# Altium schematic symbol library jlcpcb_2025_04_capacitors_extended_0603.schlib: 3668 symbols (part 18 of 20)
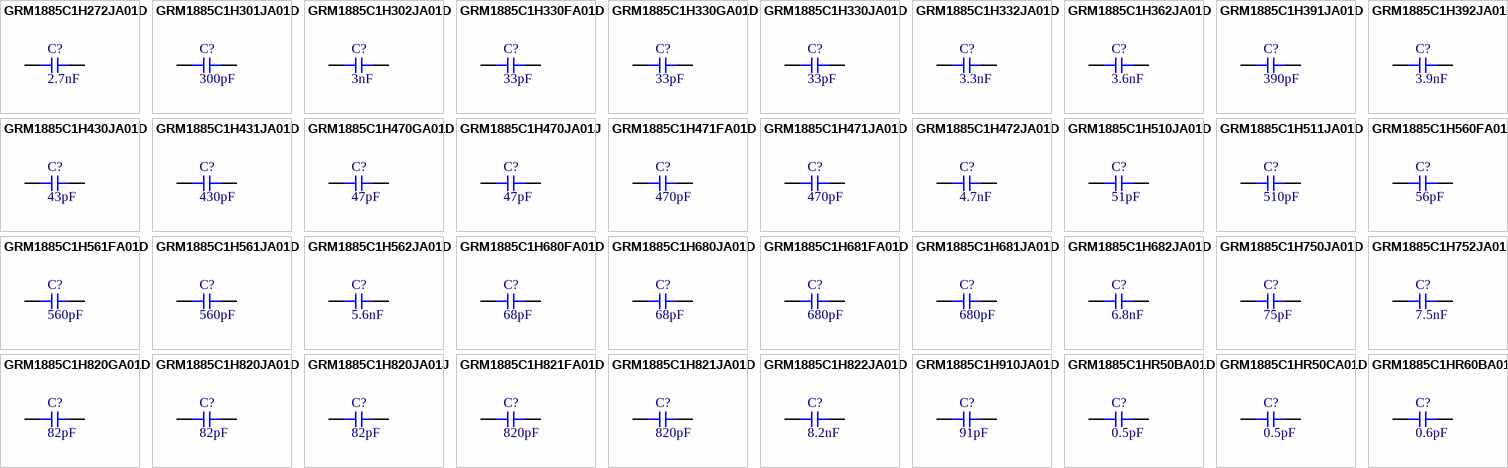
[diagram p108: symbols GRM1885C1H272JA01D to GRM1885C1HR60BA01D]

## GRM1885C1H561JA01D
designator C?  Capacitance: 560pF  (hidden comment: *)
Capacitor, Ceramic (MLCC), 560pF, ±5%, 50V, C0G, ±5%, SMD 0603; Manufacturer: Murata Electronics; Manufacturer Part Number: GRM1885C1H561JA01D; Package Size: 0603; JLCPCB Basic Part: No; JLCPCB Part Number: C97881; Supplier 1: LCSC; Category: Capacitors - MLCC; Supplier Part Number 1: C97881; Tolerance: ±5%; Voltage Rating: 50V; Temperature Coefficient: C0G; RoHS: Yes; ComponentLink1Description: Datasheet; ComponentLink1URL: https://wmsc.lcsc.com/wmsc/upload/file/pdf/v2/lcsc/1810311111_Murata-Electronics-GRM1885C1H561JA01D_C97881.pdf; ComponentLink2Description: JLCPCB Part URL; ComponentLink2URL: https://jlcpcb.com/partdetail/C97881; ComponentLink3Description: LCSC Part URL; ComponentLink3URL: https://lcsc.com/product-detail/Multilayer-Ceramic-Capacitors-MLCC---SMD-SMT_Murata-Electronics-Murata-Electronics-GRM1885C1H561JA01D_C97881.html
footprint CAP-0603 (0603 (1608M) Capacitor)
pins: 1, 2

## GRM1885C1H562JA01D
designator C?  Capacitance: 5.6nF  (hidden comment: *)
Capacitor, Ceramic (MLCC), 5.6nF, ±5%, 50V, C0G, ±5%, SMD 0603; Manufacturer: Murata Electronics; Manufacturer Part Number: GRM1885C1H562JA01D; Package Size: 0603; JLCPCB Basic Part: No; JLCPCB Part Number: C440183; Supplier 1: LCSC; Category: Capacitors - MLCC; Supplier Part Number 1: C440183; Tolerance: ±5%; Voltage Rating: 50V; Temperature Coefficient: C0G; RoHS: Yes; ComponentLink1Description: Datasheet; ComponentLink1URL: https://wmsc.lcsc.com/wmsc/upload/file/pdf/v2/lcsc/2304140030_Murata-Electronics-GRM1885C1H562JA01D_C440183.pdf; ComponentLink2Description: JLCPCB Part URL; ComponentLink2URL: https://jlcpcb.com/partdetail/C440183; ComponentLink3Description: LCSC Part URL; ComponentLink3URL: https://lcsc.com/product-detail/Multilayer-Ceramic-Capacitors-MLCC---SMD-SMT_Murata-Electronics-Murata-Electronics-GRM1885C1H562JA01D_C440183.html
footprint CAP-0603 (0603 (1608M) Capacitor)
pins: 1, 2

## GRM1885C1H680FA01D
designator C?  Capacitance: 68pF  (hidden comment: *)
Capacitor, Ceramic (MLCC), 68pF, ±1%, 50V, C0G, ±1%, SMD 0603; Manufacturer: Murata Electronics; Manufacturer Part Number: GRM1885C1H680FA01D; Package Size: 0603; JLCPCB Basic Part: No; JLCPCB Part Number: C237335; Supplier 1: LCSC; Category: Capacitors - MLCC; Supplier Part Number 1: C237335; Tolerance: ±1%; Voltage Rating: 50V; Temperature Coefficient: C0G; RoHS: Yes; ComponentLink1Description: Datasheet; ComponentLink1URL: https://wmsc.lcsc.com/wmsc/upload/file/pdf/v2/lcsc/2105241141_Murata-Electronics-GRM1885C1H680FA01D_C237335.pdf; ComponentLink2Description: JLCPCB Part URL; ComponentLink2URL: https://jlcpcb.com/partdetail/C237335; ComponentLink3Description: LCSC Part URL; ComponentLink3URL: https://lcsc.com/product-detail/Multilayer-Ceramic-Capacitors-MLCC---SMD-SMT_Murata-Electronics-Murata-Electronics-GRM1885C1H680FA01D_C237335.html
footprint CAP-0603 (0603 (1608M) Capacitor)
pins: 1, 2

## GRM1885C1H680JA01D
designator C?  Capacitance: 68pF  (hidden comment: *)
Capacitor, Ceramic (MLCC), 68pF, ±5%, 50V, C0G, ±5%, SMD 0603; Manufacturer: Murata Electronics; Manufacturer Part Number: GRM1885C1H680JA01D; Package Size: 0603; JLCPCB Basic Part: No; JLCPCB Part Number: C85981; Supplier 1: LCSC; Category: Capacitors - MLCC; Supplier Part Number 1: C85981; Tolerance: ±5%; Voltage Rating: 50V; Temperature Coefficient: C0G; RoHS: Yes; ComponentLink1Description: Datasheet; ComponentLink1URL: https://wmsc.lcsc.com/wmsc/upload/file/pdf/v2/lcsc/2304140030_Murata-Electronics-GRM1885C1H680JA01D_C85981.pdf; ComponentLink2Description: JLCPCB Part URL; ComponentLink2URL: https://jlcpcb.com/partdetail/C85981; ComponentLink3Description: LCSC Part URL; ComponentLink3URL: https://lcsc.com/product-detail/Multilayer-Ceramic-Capacitors-MLCC---SMD-SMT_Murata-Electronics-Murata-Electronics-GRM1885C1H680JA01D_C85981.html
footprint CAP-0603 (0603 (1608M) Capacitor)
pins: 1, 2

## GRM1885C1H681FA01D
designator C?  Capacitance: 680pF  (hidden comment: *)
Capacitor, Ceramic (MLCC), 680pF, ±1%, 50V, C0G, ±1%, SMD 0603; Manufacturer: Murata Electronics; Manufacturer Part Number: GRM1885C1H681FA01D; Package Size: 0603; JLCPCB Basic Part: No; JLCPCB Part Number: C527977; Supplier 1: LCSC; Category: Capacitors - MLCC; Supplier Part Number 1: C527977; Tolerance: ±1%; Voltage Rating: 50V; Temperature Coefficient: C0G; RoHS: Yes; ComponentLink1Description: Datasheet; ComponentLink1URL: https://wmsc.lcsc.com/wmsc/upload/file/pdf/v2/lcsc/2008191834_Murata-Electronics-GRM1885C1H681FA01D_C527977.pdf; ComponentLink2Description: JLCPCB Part URL; ComponentLink2URL: https://jlcpcb.com/partdetail/C527977; ComponentLink3Description: LCSC Part URL; ComponentLink3URL: https://lcsc.com/product-detail/Multilayer-Ceramic-Capacitors-MLCC---SMD-SMT_Murata-Electronics-Murata-Electronics-GRM1885C1H681FA01D_C527977.html
footprint CAP-0603 (0603 (1608M) Capacitor)
pins: 1, 2

## GRM1885C1H681JA01D
designator C?  Capacitance: 680pF  (hidden comment: *)
Capacitor, Ceramic (MLCC), 680pF, ±5%, 50V, C0G, ±5%, SMD 0603; Manufacturer: Murata Electronics; Manufacturer Part Number: GRM1885C1H681JA01D; Package Size: 0603; JLCPCB Basic Part: No; JLCPCB Part Number: C97882; Supplier 1: LCSC; Category: Capacitors - MLCC; Supplier Part Number 1: C97882; Tolerance: ±5%; Voltage Rating: 50V; Temperature Coefficient: C0G; RoHS: Yes; ComponentLink1Description: Datasheet; ComponentLink1URL: https://wmsc.lcsc.com/wmsc/upload/file/pdf/v2/lcsc/1810311111_Murata-Electronics-GRM1885C1H681JA01D_C97882.pdf; ComponentLink2Description: JLCPCB Part URL; ComponentLink2URL: https://jlcpcb.com/partdetail/C97882; ComponentLink3Description: LCSC Part URL; ComponentLink3URL: https://lcsc.com/product-detail/Multilayer-Ceramic-Capacitors-MLCC---SMD-SMT_Murata-Electronics-Murata-Electronics-GRM1885C1H681JA01D_C97882.html
footprint CAP-0603 (0603 (1608M) Capacitor)
pins: 1, 2

## GRM1885C1H682JA01D
designator C?  Capacitance: 6.8nF  (hidden comment: *)
Capacitor, Ceramic (MLCC), 6.8nF, ±5%, 50V, C0G, ±5%, SMD 0603; Manufacturer: Murata Electronics; Manufacturer Part Number: GRM1885C1H682JA01D; Package Size: 0603; JLCPCB Basic Part: No; JLCPCB Part Number: C162241; Supplier 1: LCSC; Category: Capacitors - MLCC; Supplier Part Number 1: C162241; Tolerance: ±5%; Voltage Rating: 50V; Temperature Coefficient: C0G; RoHS: Yes; ComponentLink1Description: Datasheet; ComponentLink1URL: https://wmsc.lcsc.com/wmsc/upload/file/pdf/v2/lcsc/1810311150_Murata-Electronics-GRM1885C1H682JA01D_C162241.pdf; ComponentLink2Description: JLCPCB Part URL; ComponentLink2URL: https://jlcpcb.com/partdetail/C162241; ComponentLink3Description: LCSC Part URL; ComponentLink3URL: https://lcsc.com/product-detail/Multilayer-Ceramic-Capacitors-MLCC---SMD-SMT_Murata-Electronics-Murata-Electronics-GRM1885C1H682JA01D_C162241.html
footprint CAP-0603 (0603 (1608M) Capacitor)
pins: 1, 2

## GRM1885C1H750JA01D
designator C?  Capacitance: 75pF  (hidden comment: *)
Capacitor, Ceramic (MLCC), 75pF, ±5%, null, null, ±5%, SMD 0603; Manufacturer: Murata Electronics; Manufacturer Part Number: GRM1885C1H750JA01D; Package Size: 0603; JLCPCB Basic Part: No; JLCPCB Part Number: C426100; Supplier 1: LCSC; Category: Capacitors - MLCC; Supplier Part Number 1: C426100; Tolerance: ±5%; Voltage Rating: null; Temperature Coefficient: null; RoHS: Yes; ComponentLink1Description: Datasheet; ComponentLink1URL: https://wmsc.lcsc.com/wmsc/upload/file/pdf/v2/lcsc/2304140030_Murata-Electronics-GRM1885C1H750JA01D_C426100.pdf; ComponentLink2Description: JLCPCB Part URL; ComponentLink2URL: https://jlcpcb.com/partdetail/C426100; ComponentLink3Description: LCSC Part URL; ComponentLink3URL: https://lcsc.com/product-detail/Multilayer-Ceramic-Capacitors-MLCC---SMD-SMT_Murata-Electronics-Murata-Electronics-GRM1885C1H750JA01D_C426100.html
footprint CAP-0603 (0603 (1608M) Capacitor)
pins: 1, 2

## GRM1885C1H752JA01D
designator C?  Capacitance: 7.5nF  (hidden comment: *)
Capacitor, Ceramic (MLCC), 7.5nF, ±5%, ±5%, SMD 0603; Manufacturer: Murata Electronics; Manufacturer Part Number: GRM1885C1H752JA01D; Package Size: 0603; JLCPCB Basic Part: No; JLCPCB Part Number: C907758; Supplier 1: LCSC; Category: Capacitors - MLCC; Supplier Part Number 1: C907758; Tolerance: ±5%; RoHS: Yes; ComponentLink1Description: Datasheet; ComponentLink1URL: https://wmsc.lcsc.com/wmsc/upload/file/pdf/v2/lcsc/2201242100_Murata-Electronics-GRM1885C1H752JA01D_C907758.pdf; ComponentLink2Description: JLCPCB Part URL; ComponentLink2URL: https://jlcpcb.com/partdetail/C907758; ComponentLink3Description: LCSC Part URL; ComponentLink3URL: https://lcsc.com/product-detail/Multilayer-Ceramic-Capacitors-MLCC---SMD-SMT_Murata-Electronics-Murata-Electronics-GRM1885C1H752JA01D_C907758.html
footprint CAP-0603 (0603 (1608M) Capacitor)
pins: 1, 2

## GRM1885C1H820GA01D
designator C?  Capacitance: 82pF  (hidden comment: *)
Capacitor, Ceramic (MLCC), 82pF, ±2%, null, null, ±2%, SMD 0603; Manufacturer: Murata Electronics; Manufacturer Part Number: GRM1885C1H820GA01D; Package Size: 0603; JLCPCB Basic Part: No; JLCPCB Part Number: C882516; Supplier 1: LCSC; Category: Capacitors - MLCC; Supplier Part Number 1: C882516; Tolerance: ±2%; Voltage Rating: null; Temperature Coefficient: null; RoHS: Yes; ComponentLink1Description: Datasheet; ComponentLink1URL: https://wmsc.lcsc.com/wmsc/upload/file/pdf/v2/lcsc/2201242130_Murata-Electronics-GRM1885C1H820GA01D_C882516.pdf; ComponentLink2Description: JLCPCB Part URL; ComponentLink2URL: https://jlcpcb.com/partdetail/C882516; ComponentLink3Description: LCSC Part URL; ComponentLink3URL: https://lcsc.com/product-detail/Multilayer-Ceramic-Capacitors-MLCC---SMD-SMT_Murata-Electronics-Murata-Electronics-GRM1885C1H820GA01D_C882516.html
footprint CAP-0603 (0603 (1608M) Capacitor)
pins: 1, 2

## GRM1885C1H820JA01D
designator C?  Capacitance: 82pF  (hidden comment: *)
Capacitor, Ceramic (MLCC), 82pF, ±5%, 50V, C0G, ±5%, SMD 0603; Manufacturer: Murata Electronics; Manufacturer Part Number: GRM1885C1H820JA01D; Package Size: 0603; JLCPCB Basic Part: No; JLCPCB Part Number: C97883; Supplier 1: LCSC; Category: Capacitors - MLCC; Supplier Part Number 1: C97883; Tolerance: ±5%; Voltage Rating: 50V; Temperature Coefficient: C0G; RoHS: Yes; ComponentLink1Description: Datasheet; ComponentLink1URL: https://wmsc.lcsc.com/wmsc/upload/file/pdf/v2/lcsc/1810311111_Murata-Electronics-GRM1885C1H820JA01D_C97883.pdf; ComponentLink2Description: JLCPCB Part URL; ComponentLink2URL: https://jlcpcb.com/partdetail/C97883; ComponentLink3Description: LCSC Part URL; ComponentLink3URL: https://lcsc.com/product-detail/Multilayer-Ceramic-Capacitors-MLCC---SMD-SMT_Murata-Electronics-Murata-Electronics-GRM1885C1H820JA01D_C97883.html
footprint CAP-0603 (0603 (1608M) Capacitor)
pins: 1, 2

## GRM1885C1H820JA01J
designator C?  Capacitance: 82pF  (hidden comment: *)
Capacitor, Ceramic (MLCC), 82pF, ±5%, ±5%, SMD 0603; Manufacturer: Murata Electronics; Manufacturer Part Number: GRM1885C1H820JA01J; Package Size: 0603; JLCPCB Basic Part: No; JLCPCB Part Number: C908006; Supplier 1: LCSC; Category: Capacitors - MLCC; Supplier Part Number 1: C908006; Tolerance: ±5%; RoHS: Yes; ComponentLink1Description: Datasheet; ComponentLink1URL: https://wmsc.lcsc.com/wmsc/upload/file/pdf/v2/lcsc/2201242100_Murata-Electronics-GRM1885C1H820JA01J_C908006.pdf; ComponentLink2Description: JLCPCB Part URL; ComponentLink2URL: https://jlcpcb.com/partdetail/C908006; ComponentLink3Description: LCSC Part URL; ComponentLink3URL: https://lcsc.com/product-detail/Multilayer-Ceramic-Capacitors-MLCC---SMD-SMT_Murata-Electronics-Murata-Electronics-GRM1885C1H820JA01J_C908006.html
footprint CAP-0603 (0603 (1608M) Capacitor)
pins: 1, 2

## GRM1885C1H821FA01D
designator C?  Capacitance: 820pF  (hidden comment: *)
Capacitor, Ceramic (MLCC), 820pF, ±1%, 50V, C0G, ±1%, SMD 0603; Manufacturer: Murata Electronics; Manufacturer Part Number: GRM1885C1H821FA01D; Package Size: 0603; JLCPCB Basic Part: No; JLCPCB Part Number: C524621; Supplier 1: LCSC; Category: Capacitors - MLCC; Supplier Part Number 1: C524621; Tolerance: ±1%; Voltage Rating: 50V; Temperature Coefficient: C0G; RoHS: Yes; ComponentLink1Description: Datasheet; ComponentLink1URL: https://wmsc.lcsc.com/wmsc/upload/file/pdf/v2/lcsc/2304140030_Murata-Electronics-GRM1885C1H821FA01D_C524621.pdf; ComponentLink2Description: JLCPCB Part URL; ComponentLink2URL: https://jlcpcb.com/partdetail/C524621; ComponentLink3Description: LCSC Part URL; ComponentLink3URL: https://lcsc.com/product-detail/Multilayer-Ceramic-Capacitors-MLCC---SMD-SMT_Murata-Electronics-Murata-Electronics-GRM1885C1H821FA01D_C524621.html
footprint CAP-0603 (0603 (1608M) Capacitor)
pins: 1, 2

## GRM1885C1H821JA01D
designator C?  Capacitance: 820pF  (hidden comment: *)
Capacitor, Ceramic (MLCC), 820pF, ±5%, 50V, C0G, ±5%, SMD 0603; Manufacturer: Murata Electronics; Manufacturer Part Number: GRM1885C1H821JA01D; Package Size: 0603; JLCPCB Basic Part: No; JLCPCB Part Number: C701305; Supplier 1: LCSC; Category: Capacitors - MLCC; Supplier Part Number 1: C701305; Tolerance: ±5%; Voltage Rating: 50V; Temperature Coefficient: C0G; RoHS: Yes; ComponentLink1Description: Datasheet; ComponentLink1URL: https://wmsc.lcsc.com/wmsc/upload/file/pdf/v2/lcsc/2304140030_Murata-Electronics-GRM1885C1H821JA01D_C701305.pdf; ComponentLink2Description: JLCPCB Part URL; ComponentLink2URL: https://jlcpcb.com/partdetail/C701305; ComponentLink3Description: LCSC Part URL; ComponentLink3URL: https://lcsc.com/product-detail/Multilayer-Ceramic-Capacitors-MLCC---SMD-SMT_Murata-Electronics-Murata-Electronics-GRM1885C1H821JA01D_C701305.html
footprint CAP-0603 (0603 (1608M) Capacitor)
pins: 1, 2

## GRM1885C1H822JA01D
designator C?  Capacitance: 8.2nF  (hidden comment: *)
Capacitor, Ceramic (MLCC), 8.2nF, ±5%, 50V, null, ±5%, SMD 0603; Manufacturer: Murata Electronics; Manufacturer Part Number: GRM1885C1H822JA01D; Package Size: 0603; JLCPCB Basic Part: No; JLCPCB Part Number: C162249; Supplier 1: LCSC; Category: Capacitors - MLCC; Supplier Part Number 1: C162249; Tolerance: ±5%; Voltage Rating: 50V; Temperature Coefficient: null; RoHS: Yes; ComponentLink1Description: Datasheet; ComponentLink1URL: https://wmsc.lcsc.com/wmsc/upload/file/pdf/v2/lcsc/2304140030_Murata-Electronics-GRM1885C1H822JA01D_C162249.pdf; ComponentLink2Description: JLCPCB Part URL; ComponentLink2URL: https://jlcpcb.com/partdetail/C162249; ComponentLink3Description: LCSC Part URL; ComponentLink3URL: https://lcsc.com/product-detail/Multilayer-Ceramic-Capacitors-MLCC---SMD-SMT_Murata-Electronics-Murata-Electronics-GRM1885C1H822JA01D_C162249.html
footprint CAP-0603 (0603 (1608M) Capacitor)
pins: 1, 2

## GRM1885C1H910JA01D
designator C?  Capacitance: 91pF  (hidden comment: *)
Capacitor, Ceramic (MLCC), 91pF, ±5%, null, null, ±5%, SMD 0603; Manufacturer: Murata Electronics; Manufacturer Part Number: GRM1885C1H910JA01D; Package Size: 0603; JLCPCB Basic Part: No; JLCPCB Part Number: C701317; Supplier 1: LCSC; Category: Capacitors - MLCC; Supplier Part Number 1: C701317; Tolerance: ±5%; Voltage Rating: null; Temperature Coefficient: null; RoHS: Yes; ComponentLink1Description: Datasheet; ComponentLink1URL: https://wmsc.lcsc.com/wmsc/upload/file/pdf/v2/lcsc/2304140030_Murata-Electronics-GRM1885C1H910JA01D_C701317.pdf; ComponentLink2Description: JLCPCB Part URL; ComponentLink2URL: https://jlcpcb.com/partdetail/C701317; ComponentLink3Description: LCSC Part URL; ComponentLink3URL: https://lcsc.com/product-detail/Multilayer-Ceramic-Capacitors-MLCC---SMD-SMT_Murata-Electronics-Murata-Electronics-GRM1885C1H910JA01D_C701317.html
footprint CAP-0603 (0603 (1608M) Capacitor)
pins: 1, 2

## GRM1885C1HR50BA01D
designator C?  Capacitance: 0.5pF  (hidden comment: *)
Capacitor, Ceramic (MLCC), 0.5pF, 50V, C0G, SMD 0603; Manufacturer: Murata Electronics; Manufacturer Part Number: GRM1885C1HR50BA01D; Package Size: 0603; JLCPCB Basic Part: No; JLCPCB Part Number: C162254; Supplier 1: LCSC; Category: Capacitors - MLCC; Supplier Part Number 1: C162254; Voltage Rating: 50V; Temperature Coefficient: C0G; RoHS: Yes; ComponentLink1Description: Datasheet; ComponentLink1URL: https://wmsc.lcsc.com/wmsc/upload/file/pdf/v2/lcsc/2304140030_Murata-Electronics-GRM1885C1HR50BA01D_C162254.pdf; ComponentLink2Description: JLCPCB Part URL; ComponentLink2URL: https://jlcpcb.com/partdetail/C162254; ComponentLink3Description: LCSC Part URL; ComponentLink3URL: https://lcsc.com/product-detail/Multilayer-Ceramic-Capacitors-MLCC---SMD-SMT_Murata-Electronics-Murata-Electronics-GRM1885C1HR50BA01D_C162254.html
footprint CAP-0603 (0603 (1608M) Capacitor)
pins: 1, 2

## GRM1885C1HR50CA01D
designator C?  Capacitance: 0.5pF  (hidden comment: *)
Capacitor, Ceramic (MLCC), 0.5pF, 50V, C0G, SMD 0603; Manufacturer: Murata Electronics; Manufacturer Part Number: GRM1885C1HR50CA01D; Package Size: 0603; JLCPCB Basic Part: No; JLCPCB Part Number: C162255; Supplier 1: LCSC; Category: Capacitors - MLCC; Supplier Part Number 1: C162255; Voltage Rating: 50V; Temperature Coefficient: C0G; RoHS: Yes; ComponentLink1Description: Datasheet; ComponentLink1URL: https://wmsc.lcsc.com/wmsc/upload/file/pdf/v2/lcsc/2304140030_Murata-Electronics-GRM1885C1HR50CA01D_C162255.pdf; ComponentLink2Description: JLCPCB Part URL; ComponentLink2URL: https://jlcpcb.com/partdetail/C162255; ComponentLink3Description: LCSC Part URL; ComponentLink3URL: https://lcsc.com/product-detail/Multilayer-Ceramic-Capacitors-MLCC---SMD-SMT_Murata-Electronics-Murata-Electronics-GRM1885C1HR50CA01D_C162255.html
footprint CAP-0603 (0603 (1608M) Capacitor)
pins: 1, 2

## GRM1885C1HR60BA01D
designator C?  Capacitance: 0.6pF  (hidden comment: *)
Capacitor, Ceramic (MLCC), 0.6pF, null, null, SMD 0603; Manufacturer: Murata Electronics; Manufacturer Part Number: GRM1885C1HR60BA01D; Package Size: 0603; JLCPCB Basic Part: No; JLCPCB Part Number: C882515; Supplier 1: LCSC; Category: Capacitors - MLCC; Supplier Part Number 1: C882515; Voltage Rating: null; Temperature Coefficient: null; RoHS: Yes; ComponentLink1Description: Datasheet; ComponentLink1URL: https://wmsc.lcsc.com/wmsc/upload/file/pdf/v2/lcsc/2201242130_Murata-Electronics-GRM1885C1HR60BA01D_C882515.pdf; ComponentLink2Description: JLCPCB Part URL; ComponentLink2URL: https://jlcpcb.com/partdetail/C882515; ComponentLink3Description: LCSC Part URL; ComponentLink3URL: https://lcsc.com/product-detail/Multilayer-Ceramic-Capacitors-MLCC---SMD-SMT_Murata-Electronics-Murata-Electronics-GRM1885C1HR60BA01D_C882515.html
footprint CAP-0603 (0603 (1608M) Capacitor)
pins: 1, 2

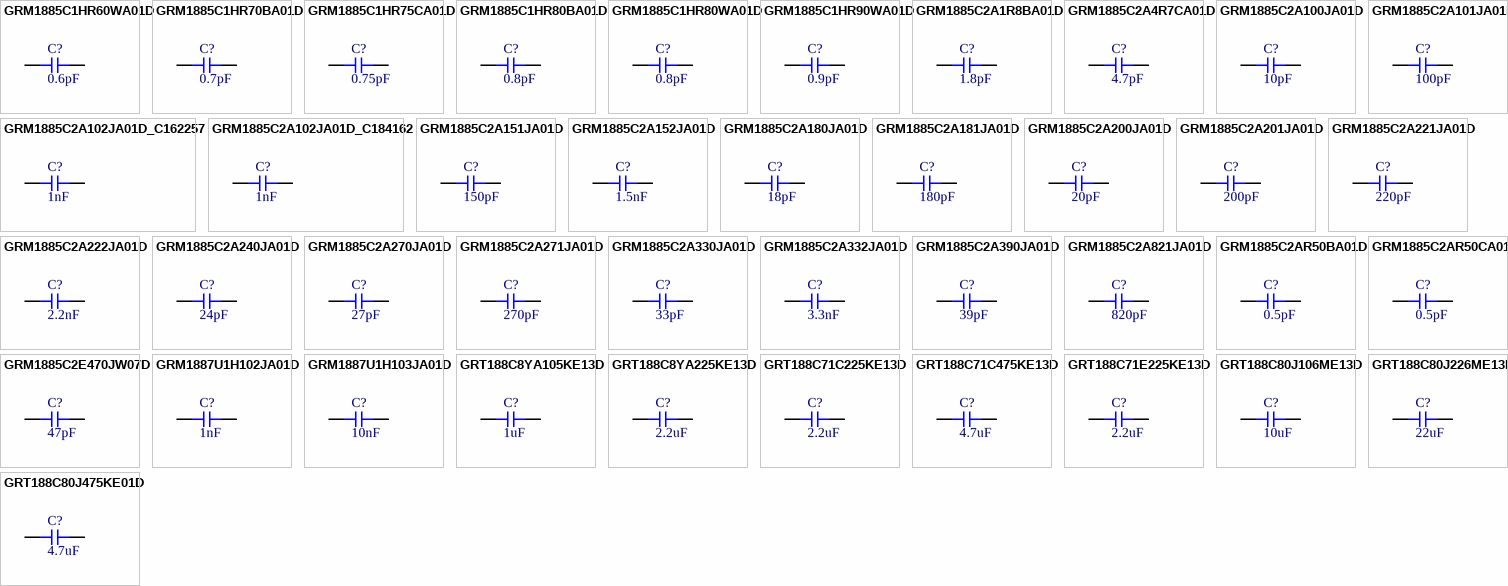
[diagram p79: symbols GRM1885C1HR60WA01D to GRT188C80J475KE01D]

## GRM1885C1HR60WA01D
designator C?  Capacitance: 0.6pF  (hidden comment: *)
Capacitor, Ceramic (MLCC), 0.6pF, 50V, C0G, SMD 0603; Manufacturer: Murata Electronics; Manufacturer Part Number: GRM1885C1HR60WA01D; Package Size: 0603; JLCPCB Basic Part: No; JLCPCB Part Number: C415380; Supplier 1: LCSC; Category: Capacitors - MLCC; Supplier Part Number 1: C415380; Voltage Rating: 50V; Temperature Coefficient: C0G; RoHS: Yes; ComponentLink1Description: Datasheet; ComponentLink1URL: https://wmsc.lcsc.com/wmsc/upload/file/pdf/v2/lcsc/2304140030_Murata-Electronics-GRM1885C1HR60WA01D_C415380.pdf; ComponentLink2Description: JLCPCB Part URL; ComponentLink2URL: https://jlcpcb.com/partdetail/C415380; ComponentLink3Description: LCSC Part URL; ComponentLink3URL: https://lcsc.com/product-detail/Multilayer-Ceramic-Capacitors-MLCC---SMD-SMT_Murata-Electronics-Murata-Electronics-GRM1885C1HR60WA01D_C415380.html
footprint CAP-0603 (0603 (1608M) Capacitor)
pins: 1, 2

## GRM1885C1HR70BA01D
designator C?  Capacitance: 0.7pF  (hidden comment: *)
Capacitor, Ceramic (MLCC), 0.7pF, 50V, C0G, SMD 0603; Manufacturer: Murata Electronics; Manufacturer Part Number: GRM1885C1HR70BA01D; Package Size: 0603; JLCPCB Basic Part: No; JLCPCB Part Number: C162256; Supplier 1: LCSC; Category: Capacitors - MLCC; Supplier Part Number 1: C162256; Voltage Rating: 50V; Temperature Coefficient: C0G; RoHS: Yes; ComponentLink1Description: Datasheet; ComponentLink1URL: https://wmsc.lcsc.com/wmsc/upload/file/pdf/v2/lcsc/2308111712_Murata-Electronics-GRM1885C1HR70BA01D_C162256.pdf; ComponentLink2Description: JLCPCB Part URL; ComponentLink2URL: https://jlcpcb.com/partdetail/C162256; ComponentLink3Description: LCSC Part URL; ComponentLink3URL: https://lcsc.com/product-detail/Multilayer-Ceramic-Capacitors-MLCC---SMD-SMT_Murata-Electronics-Murata-Electronics-GRM1885C1HR70BA01D_C162256.html
footprint CAP-0603 (0603 (1608M) Capacitor)
pins: 1, 2

## GRM1885C1HR75CA01D
designator C?  Capacitance: 0.75pF  (hidden comment: *)
Capacitor, Ceramic (MLCC), 0.75pF, 50V, C0G, SMD 0603; Manufacturer: Murata Electronics; Manufacturer Part Number: GRM1885C1HR75CA01D; Package Size: 0603; JLCPCB Basic Part: No; JLCPCB Part Number: C85982; Supplier 1: LCSC; Category: Capacitors - MLCC; Supplier Part Number 1: C85982; Voltage Rating: 50V; Temperature Coefficient: C0G; RoHS: Yes; ComponentLink1Description: Datasheet; ComponentLink1URL: https://wmsc.lcsc.com/wmsc/upload/file/pdf/v2/lcsc/2304140030_Murata-Electronics-GRM1885C1HR75CA01D_C85982.pdf; ComponentLink2Description: JLCPCB Part URL; ComponentLink2URL: https://jlcpcb.com/partdetail/C85982; ComponentLink3Description: LCSC Part URL; ComponentLink3URL: https://lcsc.com/product-detail/Multilayer-Ceramic-Capacitors-MLCC---SMD-SMT_Murata-Electronics-Murata-Electronics-GRM1885C1HR75CA01D_C85982.html
footprint CAP-0603 (0603 (1608M) Capacitor)
pins: 1, 2

## GRM1885C1HR80BA01D
designator C?  Capacitance: 0.8pF  (hidden comment: *)
Capacitor, Ceramic (MLCC), 0.8pF, 50V, C0G, SMD 0603; Manufacturer: Murata Electronics; Manufacturer Part Number: GRM1885C1HR80BA01D; Package Size: 0603; JLCPCB Basic Part: No; JLCPCB Part Number: C3880629; Supplier 1: LCSC; Category: Capacitors - MLCC; Supplier Part Number 1: C3880629; Voltage Rating: 50V; Temperature Coefficient: C0G; RoHS: Yes; ComponentLink1Description: Datasheet; ComponentLink1URL: https://wmsc.lcsc.com/wmsc/upload/file/pdf/v2/lcsc/2308111758_Murata-Electronics-GRM1885C1HR80BA01D_C3880629.pdf; ComponentLink2Description: JLCPCB Part URL; ComponentLink2URL: https://jlcpcb.com/partdetail/C3880629; ComponentLink3Description: LCSC Part URL; ComponentLink3URL: https://lcsc.com/product-detail/Multilayer-Ceramic-Capacitors-MLCC---SMD-SMT_Murata-Electronics-Murata-Electronics-GRM1885C1HR80BA01D_C3880629.html
footprint CAP-0603 (0603 (1608M) Capacitor)
pins: 1, 2

## GRM1885C1HR80WA01D
designator C?  Capacitance: 0.8pF  (hidden comment: *)
Capacitor, Ceramic (MLCC), 0.8pF, SMD 0603; Manufacturer: Murata Electronics; Manufacturer Part Number: GRM1885C1HR80WA01D; Package Size: 0603; JLCPCB Basic Part: No; JLCPCB Part Number: C907996; Supplier 1: LCSC; Category: Capacitors - MLCC; Supplier Part Number 1: C907996; RoHS: Yes; ComponentLink1Description: Datasheet; ComponentLink1URL: https://wmsc.lcsc.com/wmsc/upload/file/pdf/v2/lcsc/2201242100_Murata-Electronics-GRM1885C1HR80WA01D_C907996.pdf; ComponentLink2Description: JLCPCB Part URL; ComponentLink2URL: https://jlcpcb.com/partdetail/C907996; ComponentLink3Description: LCSC Part URL; ComponentLink3URL: https://lcsc.com/product-detail/Multilayer-Ceramic-Capacitors-MLCC---SMD-SMT_Murata-Electronics-Murata-Electronics-GRM1885C1HR80WA01D_C907996.html
footprint CAP-0603 (0603 (1608M) Capacitor)
pins: 1, 2

## GRM1885C1HR90WA01D
designator C?  Capacitance: 0.9pF  (hidden comment: *)
Capacitor, Ceramic (MLCC), 0.9pF, 50V, C0G, SMD 0603; Manufacturer: Murata Electronics; Manufacturer Part Number: GRM1885C1HR90WA01D; Package Size: 0603; JLCPCB Basic Part: No; JLCPCB Part Number: C415547; Supplier 1: LCSC; Category: Capacitors - MLCC; Supplier Part Number 1: C415547; Voltage Rating: 50V; Temperature Coefficient: C0G; RoHS: Yes; ComponentLink1Description: Datasheet; ComponentLink1URL: https://wmsc.lcsc.com/wmsc/upload/file/pdf/v2/lcsc/2304140030_Murata-Electronics-GRM1885C1HR90WA01D_C415547.pdf; ComponentLink2Description: JLCPCB Part URL; ComponentLink2URL: https://jlcpcb.com/partdetail/C415547; ComponentLink3Description: LCSC Part URL; ComponentLink3URL: https://lcsc.com/product-detail/Multilayer-Ceramic-Capacitors-MLCC---SMD-SMT_Murata-Electronics-Murata-Electronics-GRM1885C1HR90WA01D_C415547.html
footprint CAP-0603 (0603 (1608M) Capacitor)
pins: 1, 2

## GRM1885C2A1R8BA01D
designator C?  Capacitance: 1.8pF  (hidden comment: *)
Capacitor, Ceramic (MLCC), 1.8pF, 100V, C0G, SMD 0603; Manufacturer: Murata Electronics; Manufacturer Part Number: GRM1885C2A1R8BA01D; Package Size: 0603; JLCPCB Basic Part: No; JLCPCB Part Number: C408134; Supplier 1: LCSC; Category: Capacitors - MLCC; Supplier Part Number 1: C408134; Voltage Rating: 100V; Temperature Coefficient: C0G; RoHS: Yes; ComponentLink1Description: Datasheet; ComponentLink1URL: https://wmsc.lcsc.com/wmsc/upload/file/pdf/v2/lcsc/2304140030_Murata-Electronics-GRM1885C2A1R8BA01D_C408134.pdf; ComponentLink2Description: JLCPCB Part URL; ComponentLink2URL: https://jlcpcb.com/partdetail/C408134; ComponentLink3Description: LCSC Part URL; ComponentLink3URL: https://lcsc.com/product-detail/Multilayer-Ceramic-Capacitors-MLCC---SMD-SMT_Murata-Electronics-Murata-Electronics-GRM1885C2A1R8BA01D_C408134.html
footprint CAP-0603 (0603 (1608M) Capacitor)
pins: 1, 2

## GRM1885C2A4R7CA01D
designator C?  Capacitance: 4.7pF  (hidden comment: *)
Capacitor, Ceramic (MLCC), 4.7pF, 100V, C0G, SMD 0603; Manufacturer: Murata Electronics; Manufacturer Part Number: GRM1885C2A4R7CA01D; Package Size: 0603; JLCPCB Basic Part: No; JLCPCB Part Number: C162260; Supplier 1: LCSC; Category: Capacitors - MLCC; Supplier Part Number 1: C162260; Voltage Rating: 100V; Temperature Coefficient: C0G; RoHS: Yes; ComponentLink1Description: Datasheet; ComponentLink1URL: https://wmsc.lcsc.com/wmsc/upload/file/pdf/v2/lcsc/2304140030_Murata-Electronics-GRM1885C2A4R7CA01D_C162260.pdf; ComponentLink2Description: JLCPCB Part URL; ComponentLink2URL: https://jlcpcb.com/partdetail/C162260; ComponentLink3Description: LCSC Part URL; ComponentLink3URL: https://lcsc.com/product-detail/Multilayer-Ceramic-Capacitors-MLCC---SMD-SMT_Murata-Electronics-Murata-Electronics-GRM1885C2A4R7CA01D_C162260.html
footprint CAP-0603 (0603 (1608M) Capacitor)
pins: 1, 2

## GRM1885C2A100JA01D
designator C?  Capacitance: 10pF  (hidden comment: *)
Capacitor, Ceramic (MLCC), 10pF, ±5%, 100V, null, ±5%, SMD 0603; Manufacturer: Murata Electronics; Manufacturer Part Number: GRM1885C2A100JA01D; Package Size: 0603; JLCPCB Basic Part: No; JLCPCB Part Number: C701304; Supplier 1: LCSC; Category: Capacitors - MLCC; Supplier Part Number 1: C701304; Tolerance: ±5%; Voltage Rating: 100V; Temperature Coefficient: null; RoHS: Yes; ComponentLink1Description: Datasheet; ComponentLink1URL: https://wmsc.lcsc.com/wmsc/upload/file/pdf/v2/lcsc/2304140030_Murata-Electronics-GRM1885C2A100JA01D_C701304.pdf; ComponentLink2Description: JLCPCB Part URL; ComponentLink2URL: https://jlcpcb.com/partdetail/C701304; ComponentLink3Description: LCSC Part URL; ComponentLink3URL: https://lcsc.com/product-detail/Multilayer-Ceramic-Capacitors-MLCC---SMD-SMT_Murata-Electronics-Murata-Electronics-GRM1885C2A100JA01D_C701304.html
footprint CAP-0603 (0603 (1608M) Capacitor)
pins: 1, 2

## GRM1885C2A101JA01D
designator C?  Capacitance: 100pF  (hidden comment: *)
Capacitor, Ceramic (MLCC), 100pF, ±5%, 100V, C0G, ±5%, SMD 0603; Manufacturer: Murata Electronics; Manufacturer Part Number: GRM1885C2A101JA01D; Package Size: 0603; JLCPCB Basic Part: No; JLCPCB Part Number: C85983; Supplier 1: LCSC; Category: Capacitors - MLCC; Supplier Part Number 1: C85983; Tolerance: ±5%; Voltage Rating: 100V; Temperature Coefficient: C0G; RoHS: Yes; ComponentLink1Description: Datasheet; ComponentLink1URL: https://wmsc.lcsc.com/wmsc/upload/file/pdf/v2/lcsc/2304140030_Murata-Electronics-GRM1885C2A101JA01D_C85983.pdf; ComponentLink2Description: JLCPCB Part URL; ComponentLink2URL: https://jlcpcb.com/partdetail/C85983; ComponentLink3Description: LCSC Part URL; ComponentLink3URL: https://lcsc.com/product-detail/Multilayer-Ceramic-Capacitors-MLCC---SMD-SMT_Murata-Electronics-Murata-Electronics-GRM1885C2A101JA01D_C85983.html
footprint CAP-0603 (0603 (1608M) Capacitor)
pins: 1, 2

## GRM1885C2A102JA01D_C162257
designator C?  Capacitance: 1nF  (hidden comment: *)
Capacitor, Ceramic (MLCC), 1nF, ±5%, 100V, C0G, ±5%, SMD 0603; Manufacturer: Murata Electronics; Manufacturer Part Number: GRM1885C2A102JA01D; Package Size: 0603; JLCPCB Basic Part: No; JLCPCB Part Number: C162257; Supplier 1: LCSC; Category: Capacitors - MLCC; Supplier Part Number 1: C162257; Tolerance: ±5%; Voltage Rating: 100V; Temperature Coefficient: C0G; RoHS: Yes; ComponentLink1Description: Datasheet; ComponentLink1URL: https://wmsc.lcsc.com/wmsc/upload/file/pdf/v2/lcsc/1912111437_Murata-Electronics-GRM1885C2A102JA01D_C162257.pdf; ComponentLink2Description: JLCPCB Part URL; ComponentLink2URL: https://jlcpcb.com/partdetail/C162257; ComponentLink3Description: LCSC Part URL; ComponentLink3URL: https://lcsc.com/product-detail/Multilayer-Ceramic-Capacitors-MLCC---SMD-SMT_Murata-Electronics-Murata-Electronics-GRM1885C2A102JA01D_C162257.html
footprint CAP-0603 (0603 (1608M) Capacitor)
pins: 1, 2

## GRM1885C2A102JA01D_C184162
designator C?  Capacitance: 1nF  (hidden comment: *)
Capacitor, Ceramic (MLCC), 1nF, ±5%, 100V, C0G, ±5%, SMD 0603; Manufacturer: Murata Electronics; Manufacturer Part Number: GRM1885C2A102JA01D; Package Size: 0603; JLCPCB Basic Part: No; JLCPCB Part Number: C184162; Supplier 1: LCSC; Category: Capacitors - MLCC; Supplier Part Number 1: C184162; Tolerance: ±5%; Voltage Rating: 100V; Temperature Coefficient: C0G; RoHS: Yes; ComponentLink1Description: Datasheet; ComponentLink1URL: https://wmsc.lcsc.com/wmsc/upload/file/pdf/v2/lcsc/2304140030_Murata-Electronics-GRM1885C2A102JA01D_C184162.pdf; ComponentLink2Description: JLCPCB Part URL; ComponentLink2URL: https://jlcpcb.com/partdetail/C184162; ComponentLink3Description: LCSC Part URL; ComponentLink3URL: https://lcsc.com/product-detail/Multilayer-Ceramic-Capacitors-MLCC---SMD-SMT_Murata-Electronics-Murata-Electronics-GRM1885C2A102JA01D_C184162.html
footprint CAP-0603 (0603 (1608M) Capacitor)
pins: 1, 2

## GRM1885C2A151JA01D
designator C?  Capacitance: 150pF  (hidden comment: *)
Capacitor, Ceramic (MLCC), 150pF, ±5%, 100V, C0G, ±5%, SMD 0603; Manufacturer: Murata Electronics; Manufacturer Part Number: GRM1885C2A151JA01D; Package Size: 0603; JLCPCB Basic Part: No; JLCPCB Part Number: C415401; Supplier 1: LCSC; Category: Capacitors - MLCC; Supplier Part Number 1: C415401; Tolerance: ±5%; Voltage Rating: 100V; Temperature Coefficient: C0G; RoHS: Yes; ComponentLink1Description: Datasheet; ComponentLink1URL: https://wmsc.lcsc.com/wmsc/upload/file/pdf/v2/lcsc/2304140030_Murata-Electronics-GRM1885C2A151JA01D_C415401.pdf; ComponentLink2Description: JLCPCB Part URL; ComponentLink2URL: https://jlcpcb.com/partdetail/C415401; ComponentLink3Description: LCSC Part URL; ComponentLink3URL: https://lcsc.com/product-detail/Multilayer-Ceramic-Capacitors-MLCC---SMD-SMT_Murata-Electronics-Murata-Electronics-GRM1885C2A151JA01D_C415401.html
footprint CAP-0603 (0603 (1608M) Capacitor)
pins: 1, 2

## GRM1885C2A152JA01D
designator C?  Capacitance: 1.5nF  (hidden comment: *)
Capacitor, Ceramic (MLCC), 1.5nF, ±5%, 100V, C0G, ±5%, SMD 0603; Manufacturer: Murata Electronics; Manufacturer Part Number: GRM1885C2A152JA01D; Package Size: 0603; JLCPCB Basic Part: No; JLCPCB Part Number: C710906; Supplier 1: LCSC; Category: Capacitors - MLCC; Supplier Part Number 1: C710906; Tolerance: ±5%; Voltage Rating: 100V; Temperature Coefficient: C0G; RoHS: Yes; ComponentLink1Description: Datasheet; ComponentLink1URL: https://wmsc.lcsc.com/wmsc/upload/file/pdf/v2/lcsc/2401271435_Murata-Electronics-GRM1885C2A152JA01D_C710906.pdf; ComponentLink2Description: JLCPCB Part URL; ComponentLink2URL: https://jlcpcb.com/partdetail/C710906; ComponentLink3Description: LCSC Part URL; ComponentLink3URL: https://lcsc.com/product-detail/Multilayer-Ceramic-Capacitors-MLCC---SMD-SMT_Murata-Electronics-Murata-Electronics-GRM1885C2A152JA01D_C710906.html
footprint CAP-0603 (0603 (1608M) Capacitor)
pins: 1, 2

## GRM1885C2A180JA01D
designator C?  Capacitance: 18pF  (hidden comment: *)
Capacitor, Ceramic (MLCC), 18pF, ±5%, 100V, C0G, ±5%, SMD 0603; Manufacturer: Murata Electronics; Manufacturer Part Number: GRM1885C2A180JA01D; Package Size: 0603; JLCPCB Basic Part: No; JLCPCB Part Number: C3907403; Supplier 1: LCSC; Category: Capacitors - MLCC; Supplier Part Number 1: C3907403; Tolerance: ±5%; Voltage Rating: 100V; Temperature Coefficient: C0G; RoHS: Yes; ComponentLink1Description: Datasheet; ComponentLink1URL: https://wmsc.lcsc.com/wmsc/upload/file/pdf/v2/lcsc/2308111608_Murata-Electronics-GRM1885C2A180JA01D_C3907403.pdf; ComponentLink2Description: JLCPCB Part URL; ComponentLink2URL: https://jlcpcb.com/partdetail/C3907403; ComponentLink3Description: LCSC Part URL; ComponentLink3URL: https://lcsc.com/product-detail/Multilayer-Ceramic-Capacitors-MLCC---SMD-SMT_Murata-Electronics-Murata-Electronics-GRM1885C2A180JA01D_C3907403.html
footprint CAP-0603 (0603 (1608M) Capacitor)
pins: 1, 2

## GRM1885C2A181JA01D
designator C?  Capacitance: 180pF  (hidden comment: *)
Capacitor, Ceramic (MLCC), 180pF, ±5%, 100V, null, ±5%, SMD 0603; Manufacturer: Murata Electronics; Manufacturer Part Number: GRM1885C2A181JA01D; Package Size: 0603; JLCPCB Basic Part: No; JLCPCB Part Number: C882514; Supplier 1: LCSC; Category: Capacitors - MLCC; Supplier Part Number 1: C882514; Tolerance: ±5%; Voltage Rating: 100V; Temperature Coefficient: null; RoHS: Yes; ComponentLink1Description: Datasheet; ComponentLink1URL: https://wmsc.lcsc.com/wmsc/upload/file/pdf/v2/lcsc/2201242130_Murata-Electronics-GRM1885C2A181JA01D_C882514.pdf; ComponentLink2Description: JLCPCB Part URL; ComponentLink2URL: https://jlcpcb.com/partdetail/C882514; ComponentLink3Description: LCSC Part URL; ComponentLink3URL: https://lcsc.com/product-detail/Multilayer-Ceramic-Capacitors-MLCC---SMD-SMT_Murata-Electronics-Murata-Electronics-GRM1885C2A181JA01D_C882514.html
footprint CAP-0603 (0603 (1608M) Capacitor)
pins: 1, 2

## GRM1885C2A200JA01D
designator C?  Capacitance: 20pF  (hidden comment: *)
Capacitor, Ceramic (MLCC), 20pF, ±5%, 100V, null, ±5%, SMD 0603; Manufacturer: Murata Electronics; Manufacturer Part Number: GRM1885C2A200JA01D; Package Size: 0603; JLCPCB Basic Part: No; JLCPCB Part Number: C440185; Supplier 1: LCSC; Category: Capacitors - MLCC; Supplier Part Number 1: C440185; Tolerance: ±5%; Voltage Rating: 100V; Temperature Coefficient: null; RoHS: Yes; ComponentLink1Description: Datasheet; ComponentLink1URL: https://wmsc.lcsc.com/wmsc/upload/file/pdf/v2/lcsc/2009181503_Murata-Electronics-GRM1885C2A200JA01D_C440185.pdf; ComponentLink2Description: JLCPCB Part URL; ComponentLink2URL: https://jlcpcb.com/partdetail/C440185; ComponentLink3Description: LCSC Part URL; ComponentLink3URL: https://lcsc.com/product-detail/Multilayer-Ceramic-Capacitors-MLCC---SMD-SMT_Murata-Electronics-Murata-Electronics-GRM1885C2A200JA01D_C440185.html
footprint CAP-0603 (0603 (1608M) Capacitor)
pins: 1, 2

## GRM1885C2A201JA01D
designator C?  Capacitance: 200pF  (hidden comment: *)
Capacitor, Ceramic (MLCC), 200pF, ±5%, 100V, null, ±5%, SMD 0603; Manufacturer: Murata Electronics; Manufacturer Part Number: GRM1885C2A201JA01D; Package Size: 0603; JLCPCB Basic Part: No; JLCPCB Part Number: C783278; Supplier 1: LCSC; Category: Capacitors - MLCC; Supplier Part Number 1: C783278; Tolerance: ±5%; Voltage Rating: 100V; Temperature Coefficient: null; RoHS: Yes; ComponentLink1Description: Datasheet; ComponentLink1URL: https://wmsc.lcsc.com/wmsc/upload/file/pdf/v2/lcsc/2304140030_Murata-Electronics-GRM1885C2A201JA01D_C783278.pdf; ComponentLink2Description: JLCPCB Part URL; ComponentLink2URL: https://jlcpcb.com/partdetail/C783278; ComponentLink3Description: LCSC Part URL; ComponentLink3URL: https://lcsc.com/product-detail/Multilayer-Ceramic-Capacitors-MLCC---SMD-SMT_Murata-Electronics-Murata-Electronics-GRM1885C2A201JA01D_C783278.html
footprint CAP-0603 (0603 (1608M) Capacitor)
pins: 1, 2

## GRM1885C2A221JA01D
designator C?  Capacitance: 220pF  (hidden comment: *)
Capacitor, Ceramic (MLCC), 220pF, ±5%, 100V, null, ±5%, SMD 0603; Manufacturer: Murata Electronics; Manufacturer Part Number: GRM1885C2A221JA01D; Package Size: 0603; JLCPCB Basic Part: No; JLCPCB Part Number: C710907; Supplier 1: LCSC; Category: Capacitors - MLCC; Supplier Part Number 1: C710907; Tolerance: ±5%; Voltage Rating: 100V; Temperature Coefficient: null; RoHS: Yes; ComponentLink1Description: Datasheet; ComponentLink1URL: https://wmsc.lcsc.com/wmsc/upload/file/pdf/v2/lcsc/2101081033_Murata-Electronics-GRM1885C2A221JA01D_C710907.pdf; ComponentLink2Description: JLCPCB Part URL; ComponentLink2URL: https://jlcpcb.com/partdetail/C710907; ComponentLink3Description: LCSC Part URL; ComponentLink3URL: https://lcsc.com/product-detail/Multilayer-Ceramic-Capacitors-MLCC---SMD-SMT_Murata-Electronics-Murata-Electronics-GRM1885C2A221JA01D_C710907.html
footprint CAP-0603 (0603 (1608M) Capacitor)
pins: 1, 2

## GRM1885C2A222JA01D
designator C?  Capacitance: 2.2nF  (hidden comment: *)
Capacitor, Ceramic (MLCC), 2.2nF, ±5%, 100V, C0G, ±5%, SMD 0603; Manufacturer: Murata Electronics; Manufacturer Part Number: GRM1885C2A222JA01D; Package Size: 0603; JLCPCB Basic Part: No; JLCPCB Part Number: C710908; Supplier 1: LCSC; Category: Capacitors - MLCC; Supplier Part Number 1: C710908; Tolerance: ±5%; Voltage Rating: 100V; Temperature Coefficient: C0G; RoHS: Yes; ComponentLink1Description: Datasheet; ComponentLink1URL: https://wmsc.lcsc.com/wmsc/upload/file/pdf/v2/lcsc/2206281745_Murata-Electronics-GRM1885C2A222JA01D_C710908.pdf; ComponentLink2Description: JLCPCB Part URL; ComponentLink2URL: https://jlcpcb.com/partdetail/C710908; ComponentLink3Description: LCSC Part URL; ComponentLink3URL: https://lcsc.com/product-detail/Multilayer-Ceramic-Capacitors-MLCC---SMD-SMT_Murata-Electronics-Murata-Electronics-GRM1885C2A222JA01D_C710908.html
footprint CAP-0603 (0603 (1608M) Capacitor)
pins: 1, 2

## GRM1885C2A240JA01D
designator C?  Capacitance: 24pF  (hidden comment: *)
Capacitor, Ceramic (MLCC), 24pF, ±5%, 100V, C0G, ±5%, SMD 0603; Manufacturer: Murata Electronics; Manufacturer Part Number: GRM1885C2A240JA01D; Package Size: 0603; JLCPCB Basic Part: No; JLCPCB Part Number: C469169; Supplier 1: LCSC; Category: Capacitors - MLCC; Supplier Part Number 1: C469169; Tolerance: ±5%; Voltage Rating: 100V; Temperature Coefficient: C0G; RoHS: Yes; ComponentLink1Description: Datasheet; ComponentLink1URL: https://wmsc.lcsc.com/wmsc/upload/file/pdf/v2/lcsc/1912141531_Murata-Electronics-GRM1885C2A240JA01D_C469169.pdf; ComponentLink2Description: JLCPCB Part URL; ComponentLink2URL: https://jlcpcb.com/partdetail/C469169; ComponentLink3Description: LCSC Part URL; ComponentLink3URL: https://lcsc.com/product-detail/Multilayer-Ceramic-Capacitors-MLCC---SMD-SMT_Murata-Electronics-Murata-Electronics-GRM1885C2A240JA01D_C469169.html
footprint CAP-0603 (0603 (1608M) Capacitor)
pins: 1, 2

## GRM1885C2A270JA01D
designator C?  Capacitance: 27pF  (hidden comment: *)
Capacitor, Ceramic (MLCC), 27pF, ±5%, 100V, C0G, ±5%, SMD 0603; Manufacturer: Murata Electronics; Manufacturer Part Number: GRM1885C2A270JA01D; Package Size: 0603; JLCPCB Basic Part: No; JLCPCB Part Number: C524622; Supplier 1: LCSC; Category: Capacitors - MLCC; Supplier Part Number 1: C524622; Tolerance: ±5%; Voltage Rating: 100V; Temperature Coefficient: C0G; RoHS: Yes; ComponentLink1Description: Datasheet; ComponentLink1URL: https://wmsc.lcsc.com/wmsc/upload/file/pdf/v2/lcsc/2304140030_Murata-Electronics-GRM1885C2A270JA01D_C524622.pdf; ComponentLink2Description: JLCPCB Part URL; ComponentLink2URL: https://jlcpcb.com/partdetail/C524622; ComponentLink3Description: LCSC Part URL; ComponentLink3URL: https://lcsc.com/product-detail/Multilayer-Ceramic-Capacitors-MLCC---SMD-SMT_Murata-Electronics-Murata-Electronics-GRM1885C2A270JA01D_C524622.html
footprint CAP-0603 (0603 (1608M) Capacitor)
pins: 1, 2

## GRM1885C2A271JA01D
designator C?  Capacitance: 270pF  (hidden comment: *)
Capacitor, Ceramic (MLCC), 270pF, ±5%, 100V, null, ±5%, SMD 0603; Manufacturer: Murata Electronics; Manufacturer Part Number: GRM1885C2A271JA01D; Package Size: 0603; JLCPCB Basic Part: No; JLCPCB Part Number: C701291; Supplier 1: LCSC; Category: Capacitors - MLCC; Supplier Part Number 1: C701291; Tolerance: ±5%; Voltage Rating: 100V; Temperature Coefficient: null; RoHS: Yes; ComponentLink1Description: Datasheet; ComponentLink1URL: https://wmsc.lcsc.com/wmsc/upload/file/pdf/v2/lcsc/2304140030_Murata-Electronics-GRM1885C2A271JA01D_C701291.pdf; ComponentLink2Description: JLCPCB Part URL; ComponentLink2URL: https://jlcpcb.com/partdetail/C701291; ComponentLink3Description: LCSC Part URL; ComponentLink3URL: https://lcsc.com/product-detail/Multilayer-Ceramic-Capacitors-MLCC---SMD-SMT_Murata-Electronics-Murata-Electronics-GRM1885C2A271JA01D_C701291.html
footprint CAP-0603 (0603 (1608M) Capacitor)
pins: 1, 2

## GRM1885C2A330JA01D
designator C?  Capacitance: 33pF  (hidden comment: *)
Capacitor, Ceramic (MLCC), 33pF, ±5%, 100V, C0G, ±5%, SMD 0603; Manufacturer: Murata Electronics; Manufacturer Part Number: GRM1885C2A330JA01D; Package Size: 0603; JLCPCB Basic Part: No; JLCPCB Part Number: C440186; Supplier 1: LCSC; Category: Capacitors - MLCC; Supplier Part Number 1: C440186; Tolerance: ±5%; Voltage Rating: 100V; Temperature Coefficient: C0G; RoHS: Yes; ComponentLink1Description: Datasheet; ComponentLink1URL: https://wmsc.lcsc.com/wmsc/upload/file/pdf/v2/lcsc/2304140030_Murata-Electronics-GRM1885C2A330JA01D_C440186.pdf; ComponentLink2Description: JLCPCB Part URL; ComponentLink2URL: https://jlcpcb.com/partdetail/C440186; ComponentLink3Description: LCSC Part URL; ComponentLink3URL: https://lcsc.com/product-detail/Multilayer-Ceramic-Capacitors-MLCC---SMD-SMT_Murata-Electronics-Murata-Electronics-GRM1885C2A330JA01D_C440186.html
footprint CAP-0603 (0603 (1608M) Capacitor)
pins: 1, 2
